# Altium footprint library AUAV_X05.PcbLib: 69 footprints (part 4 of 5)
Each footprint in its own frame and in the unit in brackets; x right, y up, seen from the top. Pads: shape width x height; smd on the part's side, far side on the other; paste and mask are expansions set on the pad; w line width, h text height; cw(c..) or ccw(c..) is an arc to the next point about the centre after c.
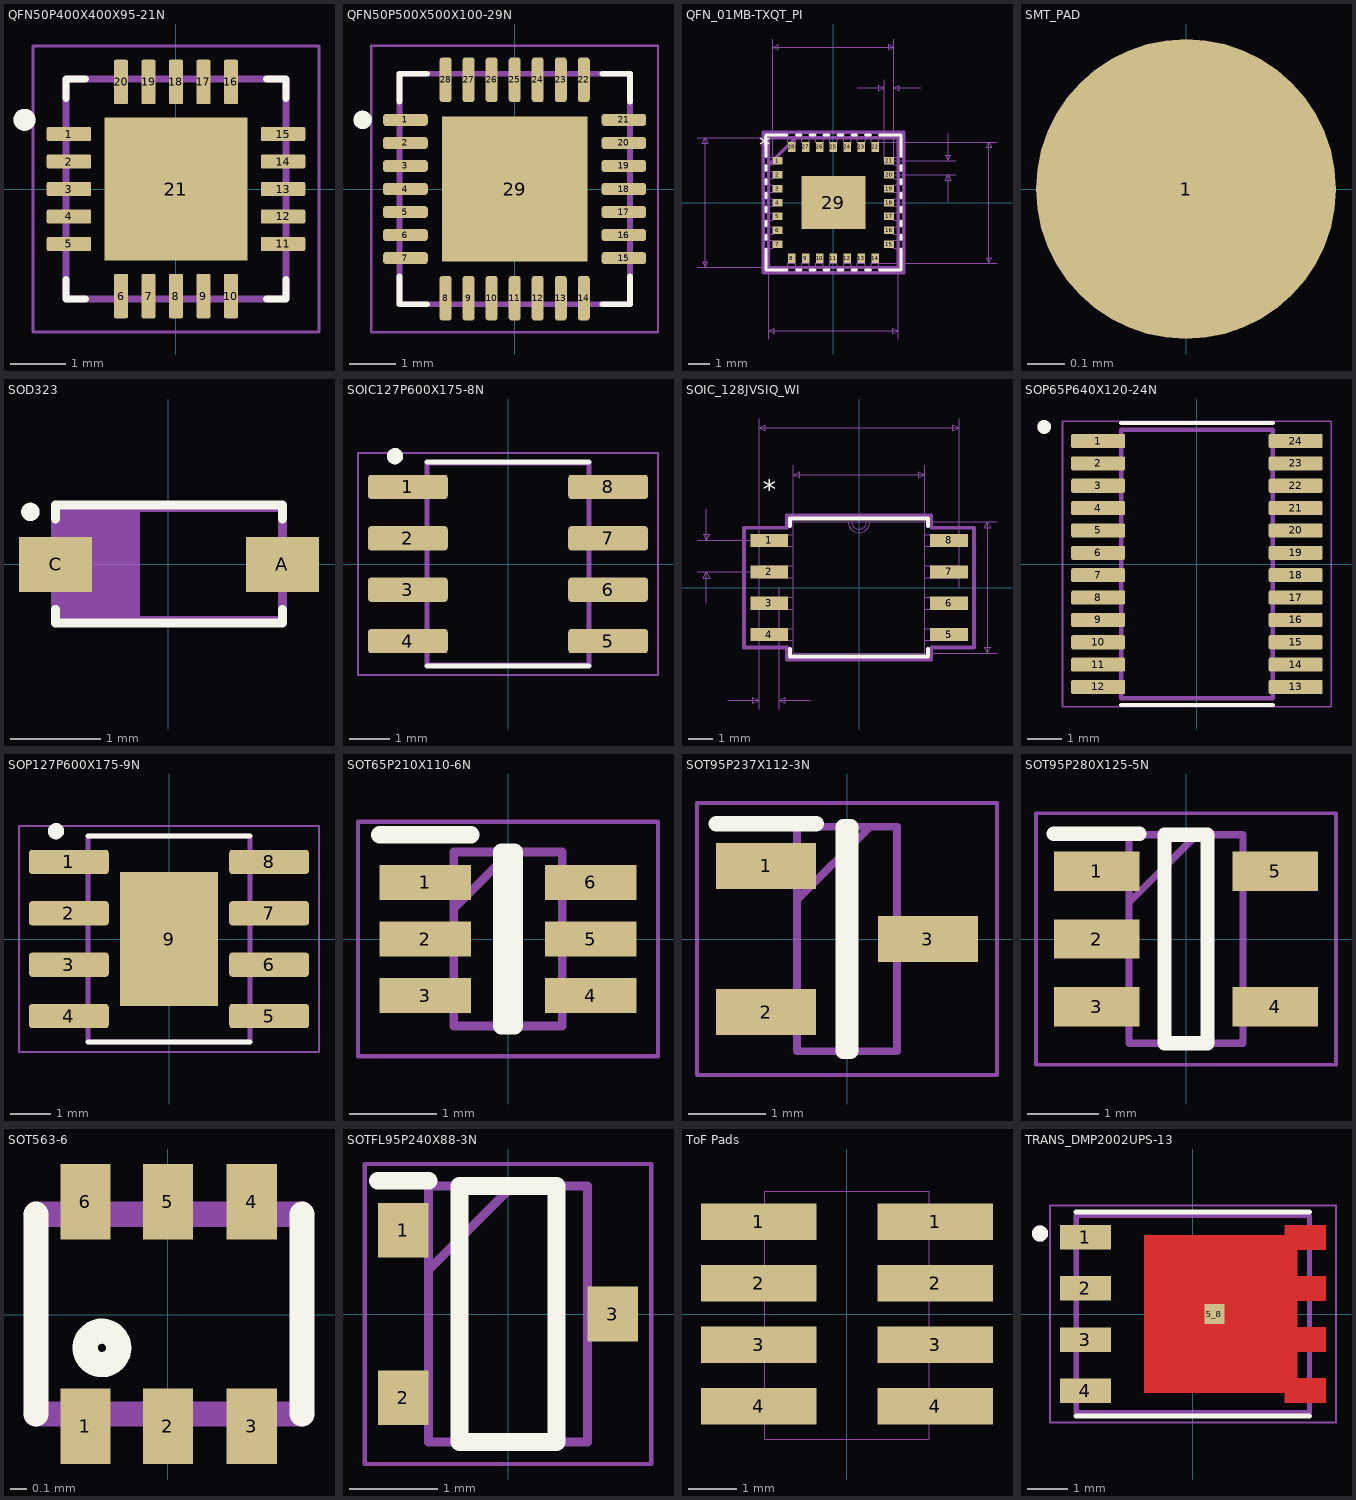
[diagram p3: the footprints below, top view; thin cyan lines are the x and y axes]

## QFN50P400X400X95-21N [mm]
pads (21):
  rrect25% 0.81x0.26 smd: 1(-1.95,1) 2(-1.95,0.5) 3(-1.95,0) 4(-1.95,-0.5) 5(-1.95,-1) 11(1.95,-1) 12(1.95,-0.5) 13(1.95,0) 14(1.95,0.5) 15(1.95,1)
  rrect25% 0.26x0.81 smd: 6(-1,-1.95) 7(-0.5,-1.95) 8(0,-1.95) 9(0.5,-1.95) 10(1,-1.95) 16(1,1.95) 17(0.5,1.95) 18(0,1.95) 19(-0.5,1.95) 20(-1,1.95)
  rect 2.6x2.6 smd paste-2: 21(0,0)
Top Overlay:
  circle w0.2: c-2.76,1.26 r0.1
  lines w0.127: -2,-1.65 -2,-2 -1.65,-2 ; -2,1.65 -2,2 -1.65,2 ; 1.65,-2 2,-2 2,-1.65 ; 1.65,2 2,2 2,1.65
Top Paste:
  region: 0.98,0.16 0.16,0.16 0.16,0.98 0.98,0.98
  region: -0.16,0.16 -0.981,0.16 -0.981,0.98 -0.16,0.98
  region: -0.16,-0.98 -0.98,-0.98 -0.98,-0.16 -0.16,-0.16
  region: 0.98,-0.98 0.16,-0.98 0.16,-0.16 0.98,-0.16
Top 3D Body:
  circle w0.2: c-2.76,1.26 r0.1
  lines w0.127: -2,-2 2,-2 2,2 -2,2 -2,-2
Mechanical 15:
  lines w0.05: -2.605,-2.605 2.605,-2.605 2.605,2.605 -2.605,2.605 -2.605,-2.605
3D body "NRF24L01--3DModel-STEP-56544.STEP": height 0.95, standoff 0, extent -2,-2 2,2

## QFN50P500X500X100-29N [mm]
pads (29):
  rrect50% 0.97x0.26 smd: 1(-2.37,1.5) 2(-2.37,1) 3(-2.37,0.5) 4(-2.37,0) 5(-2.37,-0.5) 6(-2.37,-1) 7(-2.37,-1.5) 15(2.37,-1.5) 16(2.37,-1) 17(2.37,-0.5) 18(2.37,0) 19(2.37,0.5) 20(2.37,1) 21(2.37,1.5)
  rrect50% 0.26x0.97 smd: 8(-1.5,-2.37) 9(-1,-2.37) 10(-0.5,-2.37) 11(0,-2.37) 12(0.5,-2.37) 13(1,-2.37) 14(1.5,-2.37) 22(1.5,2.37) 23(1,2.37) 24(0.5,2.37) 25(0,2.37) 26(-0.5,2.37) 27(-1,2.37) 28(-1.5,2.37)
  rect 3.15x3.15 smd paste-3: 29(0,0)
Top Overlay:
  circle w0.2: c-3.3,1.5 r0.1
  lines w0.127: -2.5,-1.9 -2.5,-2.5 -1.9,-2.5 ; -2.5,1.9 -2.5,2.5 -1.9,2.5 ; 1.9,-2.5 2.5,-2.5 2.5,-1.9 ; 1.9,2.5 2.5,2.5 2.5,1.9
Top Paste:
  region: 0.989,-0.991 -0.991,-0.991 -0.991,0.989 0.989,0.989
Top 3D Body:
  lines w0.127: -2.5,-2.5 2.5,-2.5 2.5,2.5 -2.5,2.5 -2.5,-2.5
Mechanical 15:
  lines w0.05: -3.11,-3.11 3.11,-3.11 3.11,3.11 -3.11,3.11 -3.11,-3.11
3D body "CP2102GM.STEP": height 1, standoff 0, extent -2.5,-2.5 2.5,2.5

## QFN_01MB-TXQT_PI [mil]
pads (29):
  rect 18x14 smd: 1(-102.5,76.77) 2(-102.5,51.18) 3(-102.5,25.59) 4(-102.5,0) 5(-102.5,-25.59) 6(-102.5,-51.18) 7(-102.5,-76.77) 15(102.5,-76.77) 16(102.5,-51.18) 17(102.5,-25.59) 18(102.5,0) 19(102.5,25.59) 20(102.5,51.18) 21(102.5,76.77)
  rect 14x18 smd: 8(-76.77,-102.5) 9(-51.18,-102.5) 10(-25.59,-102.5) 11(0,-102.5) 12(25.59,-102.5) 13(51.18,-102.5) 14(76.77,-102.5) 22(76.77,102.5) 23(51.18,102.5) 24(25.59,102.5) 25(0,102.5) 26(-25.59,102.5) 27(-51.18,102.5) 28(-76.77,102.5)
  rect 118x98 smd: 29(0,0)
Top Overlay:
  lines w6: -124.5,-85.39 -124.5,-124.5 -85.39,-124.5 ; -124.5,-68.15 -124.5,-59.8 ; -124.5,-42.56 -124.5,-34.21 ; -124.5,-16.97 -124.5,-8.62 ; -124.5,8.62 -124.5,16.97 ; -124.5,34.21 -124.5,42.56 ; -124.5,59.8 -124.5,68.15 ; -124.5,85.39 -124.5,124.5 -85.39,124.5 ; -68.15,-124.5 -59.8,-124.5 ; -68.15,124.5 -59.8,124.5 ; -42.56,-124.5 -34.21,-124.5 ; -42.56,124.5 -34.21,124.5 ; -16.97,-124.5 -8.62,-124.5 ; -16.97,124.5 -8.62,124.5 ; 8.62,-124.5 16.97,-124.5 ; 8.62,124.5 16.97,124.5 ; 34.21,-124.5 42.56,-124.5 ; 34.21,124.5 42.56,124.5 ; 59.8,-124.5 68.15,-124.5 ; 59.8,124.5 68.15,124.5 ; 85.39,-124.5 124.5,-124.5 124.5,-85.39 ; 85.39,124.5 124.5,124.5 124.5,85.39 ; 124.5,-68.15 124.5,-59.8 ; 124.5,-42.56 124.5,-34.21 ; 124.5,-16.97 124.5,-8.62 ; 124.5,8.62 124.5,16.97 ; 124.5,34.21 124.5,42.56 ; 124.5,59.8 124.5,68.15
  text "*" at -136.5,89.56 h31.25
Mechanical 1:
  lines w1: -119.5,69.5 -69.5,119.5 ; -119.5,-119.5 -119.5,119.5 119.5,119.5 119.5,-119.5 -119.5,-119.5 ; -119.5,-83.77 -111.5,-83.77 -111.5,-69.77 -119.5,-69.77 -119.5,-83.77 ; -119.5,-58.18 -111.5,-58.18 -111.5,-44.18 -119.5,-44.18 -119.5,-58.18 ; -119.5,-32.59 -111.5,-32.59 -111.5,-18.59 -119.5,-18.59 -119.5,-32.59 ; -119.5,-7 -111.5,-7 -111.5,7 -119.5,7 -119.5,-7 ; -119.5,18.59 -111.5,18.59 -111.5,32.59 -119.5,32.59 -119.5,18.59 ; -119.5,44.18 -111.5,44.18 -111.5,58.18 -119.5,58.18 -119.5,44.18 ; -119.5,69.77 -111.5,69.77 -111.5,83.77 -119.5,83.77 -119.5,69.77 ; -83.77,-119.5 -83.77,-111.5 -69.77,-111.5 -69.77,-119.5 -83.77,-119.5 ; -83.77,111.5 -83.77,119.5 -69.77,119.5 -69.77,111.5 -83.77,111.5 ; -58.18,-119.5 -58.18,-111.5 -44.18,-111.5 -44.18,-119.5 -58.18,-119.5 ; -58.18,111.5 -58.18,119.5 -44.18,119.5 -44.18,111.5 -58.18,111.5 ; -32.59,-119.5 -32.59,-111.5 -18.59,-111.5 -18.59,-119.5 -32.59,-119.5 ; -32.59,111.5 -32.59,119.5 -18.59,119.5 -18.59,111.5 -32.59,111.5 ; -7,-119.5 -7,-111.5 7,-111.5 7,-119.5 -7,-119.5 ; -7,111.5 -7,119.5 7,119.5 7,111.5 -7,111.5 ; 18.59,-119.5 18.59,-111.5 32.59,-111.5 32.59,-119.5 18.59,-119.5 ; 18.59,111.5 18.59,119.5 32.59,119.5 32.59,111.5 18.59,111.5 ; 44.18,-119.5 44.18,-111.5 58.18,-111.5 58.18,-119.5 44.18,-119.5 ; 44.18,111.5 44.18,119.5 58.18,119.5 58.18,111.5 44.18,111.5 ; 69.77,-119.5 69.77,-111.5 83.77,-111.5 83.77,-119.5 69.77,-119.5 ; 69.77,111.5 69.77,119.5 83.77,119.5 83.77,111.5 69.77,111.5 ; 111.5,-83.77 111.5,-69.77 119.5,-69.77 119.5,-83.77 111.5,-83.77 ; 111.5,-58.18 111.5,-44.18 119.5,-44.18 119.5,-58.18 111.5,-58.18 ; 111.5,-32.59 111.5,-18.59 119.5,-18.59 119.5,-32.59 111.5,-32.59 ; 111.5,-7 111.5,7 119.5,7 119.5,-7 111.5,-7 ; 111.5,18.59 111.5,32.59 119.5,32.59 119.5,18.59 111.5,18.59 ; 111.5,44.18 111.5,58.18 119.5,58.18 119.5,44.18 111.5,44.18 ; 111.5,69.77 111.5,83.77 119.5,83.77 119.5,69.77 111.5,69.77
  text "*" at -93.5,89.56 h31.25
Mechanical 16:
  lines w1: -251.5,-119.5 119.5,-119.5 ; -251.5,119.5 119.5,119.5 119.5,-251.5 ; -119.5,-251.5 -119.5,119.5 ; -111.5,76.77 -111.5,301.5 ; 43.5,211.5 93.5,211.5 ; 76.77,-111.5 301.5,-111.5 ; 76.77,111.5 301.5,111.5 ; 93.5,76.77 93.5,226.5 ; 102.5,51.18 226.5,51.18 ; 102.5,76.77 226.5,76.77 ; 111.5,226.5 111.5,76.77 111.5,301.5 ; 161.5,211.5 111.5,211.5 ; 211.5,1.18 211.5,51.18 ; 211.5,126.77 211.5,76.77 ; -236.5,-119.5 -231.5,-109.5 -241.5,-109.5 -236.5,-119.5 ; -236.5,-119.5 -236.5,119.5 ; -236.5,119.5 -231.5,109.5 -241.5,109.5 -236.5,119.5 ; -119.5,-236.5 -109.5,-241.5 -109.5,-231.5 -119.5,-236.5 ; -119.5,-236.5 119.5,-236.5 ; -111.5,286.5 -101.5,281.5 -101.5,291.5 -111.5,286.5 ; -111.5,286.5 111.5,286.5 ; 93.5,211.5 83.5,206.5 83.5,216.5 93.5,211.5 ; 111.5,211.5 121.5,206.5 121.5,216.5 111.5,211.5 ; 111.5,286.5 101.5,281.5 101.5,291.5 111.5,286.5 ; 119.5,-236.5 109.5,-241.5 109.5,-231.5 119.5,-236.5 ; 211.5,51.18 216.5,41.18 206.5,41.18 211.5,51.18 ; 211.5,76.77 216.5,86.77 206.5,86.77 211.5,76.77 ; 286.5,-111.5 291.5,-101.5 281.5,-101.5 286.5,-111.5 ; 286.5,-111.5 286.5,111.5 ; 286.5,111.5 291.5,101.5 281.5,101.5 286.5,111.5
  lines w6: -119.5,69.5 -69.5,119.5 ; -129.5,-129.5 -93.77,-129.5 93.77,-129.5 129.5,-129.5 129.5,-93.77 129.5,93.77 129.5,129.5 93.77,129.5 -93.77,129.5 -129.5,129.5 -129.5,93.77 -129.5,-93.77 -129.5,-129.5 ; -119.5,-119.5 119.5,-119.5 119.5,119.5 -119.5,119.5 -119.5,-119.5
  text "0.239in/6.071mm" at 0,-256.5 h15.62
  text "0.239in/6.071mm" at -256.5,0 h15.62
  text "0.223in/5.664mm" at 306.5,0 h15.62
  text "0.223in/5.664mm" at 0,306.5 h15.62
  text "0.018in/0.457mm" at 102.5,231.5 h15.62
  text "0.026in/0.65mm" at 231.5,63.98 h15.62
  text "Alt 2 Padstyle: OX90Y60D30P" at 0,-611.5 h31.25
  text "Alt 1 Padstyle: OX60Y90D30P" at 0,-551.5 h31.25
  text "Heat Tab Padstyle: RX118Y98D0T" at 0,-431.5 h31.25
  text "Default Padstyle: RX14Y18D0T" at 0,-371.5 h31.25
3D body "IC_PixArt_Imaging_Inc._PMW3901MB-TXQT_eec.STEP": height 93.3, standoff 0, extent -118.1,-118.1 118.12,118.12

## SMT_PAD [mm]
pads (1):
  round 0.8 smd paste-0.635: 1(0,0)

## SOD323 [mil] "SOD323"
pads (2):
  rect 32x24 smd: A(50,0) C(-49.21,0)
Top Overlay:
  circle w4: c-60.24,23 r2
  lines w4: -49.21,-19.68 -49.21,-25.59 50,-25.59 50,-19.68 ; -49.21,20 -49.21,26 50,26 50,20
Mechanical 16:
  rectangle: -49.21,-24.61 -12.3,25
  rectangle: -60.97,-7.87 -49.16,8
  rectangle: 52,-7.87 62,8
  lines w4: -49.21,-24.61 50,-24.61 50,25 -49.21,25 -49.21,-24.61
3D body "User Library-SOD323.step": height 35.43, standoff -3.54, extent -49.21,-24.21 49.21,25

## SOIC127P600X175-8N [mm]
pads (8):
  rrect25% 1.97x0.6 smd: 1(-2.475,1.905) 2(-2.475,0.635) 3(-2.475,-0.635) 4(-2.475,-1.905) 5(2.475,-1.905) 6(2.475,-0.635) 7(2.475,0.635) 8(2.475,1.905)
Top Overlay:
  circle w0.2: c-2.794,2.667 r0.1
  lines w0.127: -2,-2.52 2,-2.52 ; -2,2.52 2,2.52
Top 3D Body:
  circle w0.2: c-2.794,2.667 r0.1
  lines w0.127: -2,-2.5 -2,2.5 2,2.5 2,-2.5 -2,-2.5
Mechanical 15:
  lines w0.05: -3.71,-2.75 -3.71,2.75 3.71,2.75 3.71,-2.75 -3.71,-2.75
3D body "IR2103STRPBF.STEP": height 1.75, standoff 0, extent -3,-2.5 3,2.5

## SOIC_128JVSIQ_WI [mil]
pads (8):
  rect 60x21 smd: 1(-143.5,75) 2(-143.5,25) 3(-143.5,-25) 4(-143.5,-75) 5(143.5,-75) 6(143.5,-25) 7(143.5,25) 8(143.5,75)
Top Overlay:
  lines w6: -110,-98.12 -110,-110 110,-110 110,-98.12 ; -110,98.12 -110,110 110,110 110,98.12
  text "*" at -153.5,141 h31.25
Mechanical 1:
  lines w1: -12,105 ccw(c0,105) 12,105 ; -159.5,-84.5 -105,-84.5 -105,-65.5 -159.5,-65.5 -159.5,-84.5 ; -159.5,-34.5 -105,-34.5 -105,-15.5 -159.5,-15.5 -159.5,-34.5 ; -159.5,15.5 -105,15.5 -105,34.5 -159.5,34.5 -159.5,15.5 ; -159.5,65.5 -105,65.5 -105,84.5 -159.5,84.5 -159.5,65.5 ; -105,-105 -105,105 105,105 105,-105 -105,-105 ; 105,-84.5 159.5,-84.5 159.5,-65.5 105,-65.5 105,-84.5 ; 105,-34.5 159.5,-34.5 159.5,-15.5 105,-15.5 105,-34.5 ; 105,15.5 159.5,15.5 159.5,34.5 105,34.5 105,15.5 ; 105,65.5 159.5,65.5 159.5,84.5 105,84.5 105,65.5
  text "*" at -90,102 h31.25
Mechanical 16:
  lines w1: -258.5,25 -143.5,25 ; -258.5,75 -143.5,75 ; -243.5,-25 -243.5,25 ; -243.5,125 -243.5,75 ; -209.5,-180 -159.5,-180 ; -159.5,-195 -159.5,0 -159.5,270 ; -127.5,-195 -127.5,0 ; -105,0 -105,195 ; -77.5,-180 -127.5,-180 ; -17.5,105 ccw(c0,105) 17.5,105 ; 0,-105 220,-105 ; 0,105 220,105 ; 105,0 105,195 ; 159.5,0 159.5,270 ; -243.5,25 -238.5,15 -248.5,15 -243.5,25 ; -243.5,75 -238.5,85 -248.5,85 -243.5,75 ; -159.5,-180 -169.5,-185 -169.5,-175 -159.5,-180 ; -159.5,255 -149.5,250 -149.5,260 -159.5,255 ; -159.5,255 159.5,255 ; -127.5,-180 -117.5,-185 -117.5,-175 -127.5,-180 ; -105,180 -95,175 -95,185 -105,180 ; -105,180 105,180 ; 105,180 95,175 95,185 105,180 ; 159.5,255 149.5,250 149.5,260 159.5,255 ; 205,-105 210,-95 200,-95 205,-105 ; 205,-105 205,105 ; 205,105 210,95 200,95 205,105 ; -105,-105 105,-105 105,105 -105,105 -105,-105
  lines w6: -183.5,-95.5 -115,-95.5 -115,-115 115,-115 115,-95.5 183.5,-95.5 183.5,95.5 115,95.5 115,115 -115,115 -115,95.5 -183.5,95.5 -183.5,-95.5
  text "0.032in/0.813mm" at -143.5,-200 h15.62
  text "0.05in/1.27mm" at -263.5,50 h15.62
  text "0.21in/5.334mm" at 225,0 h15.62
  text "0.319in/8.103mm" at 0,275 h15.62
  text "0.21in/5.334mm" at 0,200 h15.62
  text "Alt 2 Padstyle: OX90Y60D30P" at 0,-555 h31.25
  text "Alt 1 Padstyle: OX60Y90D30P" at 0,-495 h31.25
  text "Pin One Padstyle: RX60Y21D0T" at 0,-315 h31.25
  text "Default Padstyle: RX60Y21D0T" at 0,-255 h31.25
3D body "SOIC_128JVSIQ_WIN.step": height 85.12, standoff 0, extent -158.98,-105 160,105

## SOP65P640X120-24N [mm]
pads (24):
  rrect25% 1.57x0.41 smd: 1(-2.87,3.575) 2(-2.87,2.925) 3(-2.87,2.275) 4(-2.87,1.625) 5(-2.87,0.975) 6(-2.87,0.325) 7(-2.87,-0.325) 8(-2.87,-0.975) 9(-2.87,-1.625) 10(-2.87,-2.275) 11(-2.87,-2.925) 12(-2.87,-3.575) 13(2.87,-3.575) 14(2.87,-2.925) 15(2.87,-2.275) 16(2.87,-1.625) 17(2.87,-0.975) 18(2.87,-0.325) 19(2.87,0.325) 20(2.87,0.975) 21(2.87,1.625) 22(2.87,2.275) 23(2.87,2.925) 24(2.87,3.575)
Top Overlay:
  circle w0.2: c-4.44,3.985 r0.1
  lines w0.127: -2.2,-4.1 2.2,-4.1 ; -2.2,4.1 2.2,4.1
Top 3D Body:
  circle w0.2: c-4.44,3.985 r0.1
  lines w0.127: -2.2,-3.9 2.2,-3.9 2.2,3.9 -2.2,3.9 -2.2,-3.9
Mechanical 15:
  lines w0.05: -3.905,-4.15 3.905,-4.15 3.905,4.15 -3.905,4.15 -3.905,-4.15
3D body "TCA9548APWR.STEP": height 1.2, standoff 0, extent -3.2,-3.9 3.2,3.9

## SOP127P600X175-9N [mm]
pads (9):
  rrect25% 1.97x0.6 smd: 1(-2.475,1.905) 2(-2.475,0.635) 3(-2.475,-0.635) 4(-2.475,-1.905) 5(2.475,-1.905) 6(2.475,-0.635) 7(2.475,0.635) 8(2.475,1.905)
  rect 2.413x3.302 smd paste-3: 9(0,0)
Top Overlay:
  circle w0.2: c-2.794,2.667 r0.1
  lines w0.127: -2,-2.55 2,-2.55 ; -2,2.55 2,2.55
Top Paste:
  region: 0.645,-0.82 -0.645,-0.82 -0.645,0.82 0.645,0.82
Top 3D Body:
  circle w0.2: c-2.794,2.667 r0.1
  lines w0.127: -2,-2.55 -2,2.55 2,2.55 2,-2.55 -2,-2.55
Mechanical 15:
  lines w0.05: -3.71,-2.8 -3.71,2.8 3.71,2.8 3.71,-2.8 -3.71,-2.8
3D body "TP4056--3DModel-STEP-1.STEP": height 1.7, standoff 0, extent -3.048,-2.45 2.952,2.45

## SOT65P210X110-6N [mm]
pads (6):
  rect 1.05x0.4 smd: 1(-0.95,0.65) 2(-0.95,0) 3(-0.95,-0.65) 4(0.95,-0.65) 5(0.95,0) 6(0.95,0.65)
Top Overlay:
  lines w0.2: -1.475,1.2 -0.425,1.2 ; -0.075,-1 0.075,-1 0.075,1 -0.075,1 -0.075,-1
Top 3D Body:
  lines w0.1: -0.625,0.35 0.025,1 ; -0.625,-1 0.625,-1 0.625,1 -0.625,1 -0.625,-1
Mechanical 15:
  lines w0.05: -1.725,-1.35 1.725,-1.35 1.725,1.35 -1.725,1.35 -1.725,-1.35
3D body "BC847BDW1T3G.stp": height 1.1, standoff 0, extent -1.05,-1 1.05,1

## SOT95P237X112-3N [mm]
pads (3):
  rect 1.3x0.6 smd: 1(-1.05,0.95) 2(-1.05,-0.95) 3(1.05,0)
Top Overlay:
  lines w0.2: -1.7,1.5 -0.4,1.5 ; -0.05,-1.46 0.05,-1.46 0.05,1.46 -0.05,1.46 -0.05,-1.46
Top 3D Body:
  lines w0.1: -0.65,0.51 0.3,1.46 ; -0.65,-1.46 0.65,-1.46 0.65,1.46 -0.65,1.46 -0.65,-1.46
Mechanical 15:
  lines w0.05: -1.95,-1.77 1.95,-1.77 1.95,1.77 -1.95,1.77 -1.95,-1.77
3D body "SQ2310ES-T1.stp": height 1.12, standoff 0, extent -1.185,-1.46 1.185,1.46

## SOT95P280X125-5N [mm]
pads (5):
  rect 1.2x0.55 smd: 1(-1.25,0.95) 2(-1.25,0) 3(-1.25,-0.95) 4(1.25,-0.95) 5(1.25,0.95)
Top Overlay:
  lines w0.2: -1.85,1.475 -0.65,1.475 ; -0.3,-1.46 -0.3,1.46 0.3,1.46 0.3,-1.46 -0.3,-1.46
Top 3D Body:
  lines w0.1: -0.8,0.51 0.15,1.46 ; -0.8,-1.46 -0.8,1.46 0.8,1.46 0.8,-1.46 -0.8,-1.46
Mechanical 15:
  lines w0.05: -2.1,-1.76 -2.1,1.76 2.1,1.76 2.1,-1.76 -2.1,-1.76
3D body "SGM2019-ADJYN5G-TR.stp": height 1.25, standoff 0, extent -1.4,-1.46 1.4,1.46

## SOT563-6 [mil] "SOT563-6"
pads (6):
  rect 12x18 smd: 1(-19.68,-26.57) 2(0,-26.57) 3(20,-26.57) 4(20,27) 5(0,27) 6(-19.68,27)
Top Overlay:
  circle w6: c-15.75,-7.87 r4
  lines w6: -31.5,-23.62 -31.5,24 ; 32,-23.62 32,24
Mechanical 16:
  lines w6: -31.5,-23.62 32,-23.62 ; -31.5,24 32,24
3D body "User Library-SOT-563.step": height 23, standoff 0, extent -31.5,-32 31.5,32

## SOTFL95P240X88-3N [mm]
pads (3):
  rect 0.575x0.62 smd: 1(-1.188,0.95) 2(-1.188,-0.95) 3(1.188,0)
Top Overlay:
  lines w0.2: -1.475,1.51 -0.9,1.51 ; -0.55,-1.45 0.55,-1.45 0.55,1.45 -0.55,1.45 -0.55,-1.45
Top 3D Body:
  lines w0.1: -0.9,0.5 0.05,1.45 ; -0.9,-1.45 0.9,-1.45 0.9,1.45 -0.9,1.45 -0.9,-1.45
Mechanical 15:
  lines w0.05: -1.625,-1.7 1.625,-1.7 1.625,1.7 -1.625,1.7 -1.625,-1.7
3D body "SSM3J334R,LF_T.stp": height 0.88, standoff 0, extent -1.2,-1.45 1.2,1.45

## ToF Pads [mil]
pads (8):
  rect 94x30 smd: 1(-71.75,75.39) 1(71.95,75.39) 2(-71.75,25.39) 2(71.95,25.39) 3(-71.75,-24.61) 3(71.95,-24.61) 4(-71.75,-74.61) 4(71.95,-74.61)
Mechanical 1:
  lines w1: -66.9,-101.38 -66.9,100.39 67.1,100.39 67.1,-101.38 -66.9,-101.38

## TRANS_DMP2002UPS-13 [mm]
pads (5):
  rect 1.27x0.61 smd: 1(-2.67,1.905) 2(-2.67,0.635) 3(-2.67,-0.635) 4(-2.67,-1.905)
  rect 0.5x0.5 smd paste+0.855 mask+0: 5_8(0.535,0)
Top Layer:
  region: 3.305,1.6 2.595,1.6 2.595,0.94 3.305,0.94 3.305,0.33 2.595,0.33 2.595,-0.33 3.305,-0.33 3.305,-0.94 2.595,-0.94 2.595,-1.6 3.305,-1.6 3.305,-2.21 2.285,-2.21 2.285,-1.955 -1.215,-1.955 -1.215,1.955 2.285,1.955 2.285,2.21 3.305,2.21
Top Overlay:
  circle w0.2: c-3.8,2 r0.1
  lines w0.127: -2.9,-2.53 2.9,-2.53 ; -2.9,2.53 2.9,2.53
Top Paste:
  region: 3.305,-2.21 2.6,-2.21 2.6,-1.6 3.305,-1.6
  region: 3.305,-0.94 2.6,-0.94 2.6,-0.33 3.305,-0.33
  region: 3.305,0.33 2.6,0.33 2.6,0.94 3.305,0.94
  region: 3.305,1.6 2.6,1.6 2.6,2.21 3.305,2.21
Top Solder:
  region: 3.405,1.5 2.695,1.5 2.695,1.04 3.405,1.04 3.405,0.23 2.695,0.23 2.695,-0.23 3.405,-0.23 3.405,-1.04 2.695,-1.04 2.695,-1.5 3.405,-1.5 3.405,-2.31 2.185,-2.31 2.185,-2.055 -1.315,-2.055 -1.315,2.055 2.185,2.055 2.185,2.31 3.405,2.31
Top 3D Body:
  circle w0.2: c-3.8,2 r0.1
  lines w0.127: -2.9,-2.45 2.9,-2.45 2.9,2.45 -2.9,2.45 -2.9,-2.45
Mechanical 15:
  lines w0.05: -3.555,-2.7 -3.555,2.7 3.555,2.7 3.555,-2.7 -3.555,-2.7
3D body "POWERDI5060-8_K_DIO.step": height 1.09, standoff 0, extent -3.073,-2.578 3.073,2.578